# Altium footprint library THU VIEN PCB.PCBLib: 534 footprints (part 20 of 34)
Each footprint in its own frame and in the unit in brackets; x right, y up, seen from the top. Pads: shape width x height; smd on the part's side, far side on the other; paste and mask are expansions set on the pad; w line width, h text height; cw(c..) or ccw(c..) is an arc to the next point about the centre after c.
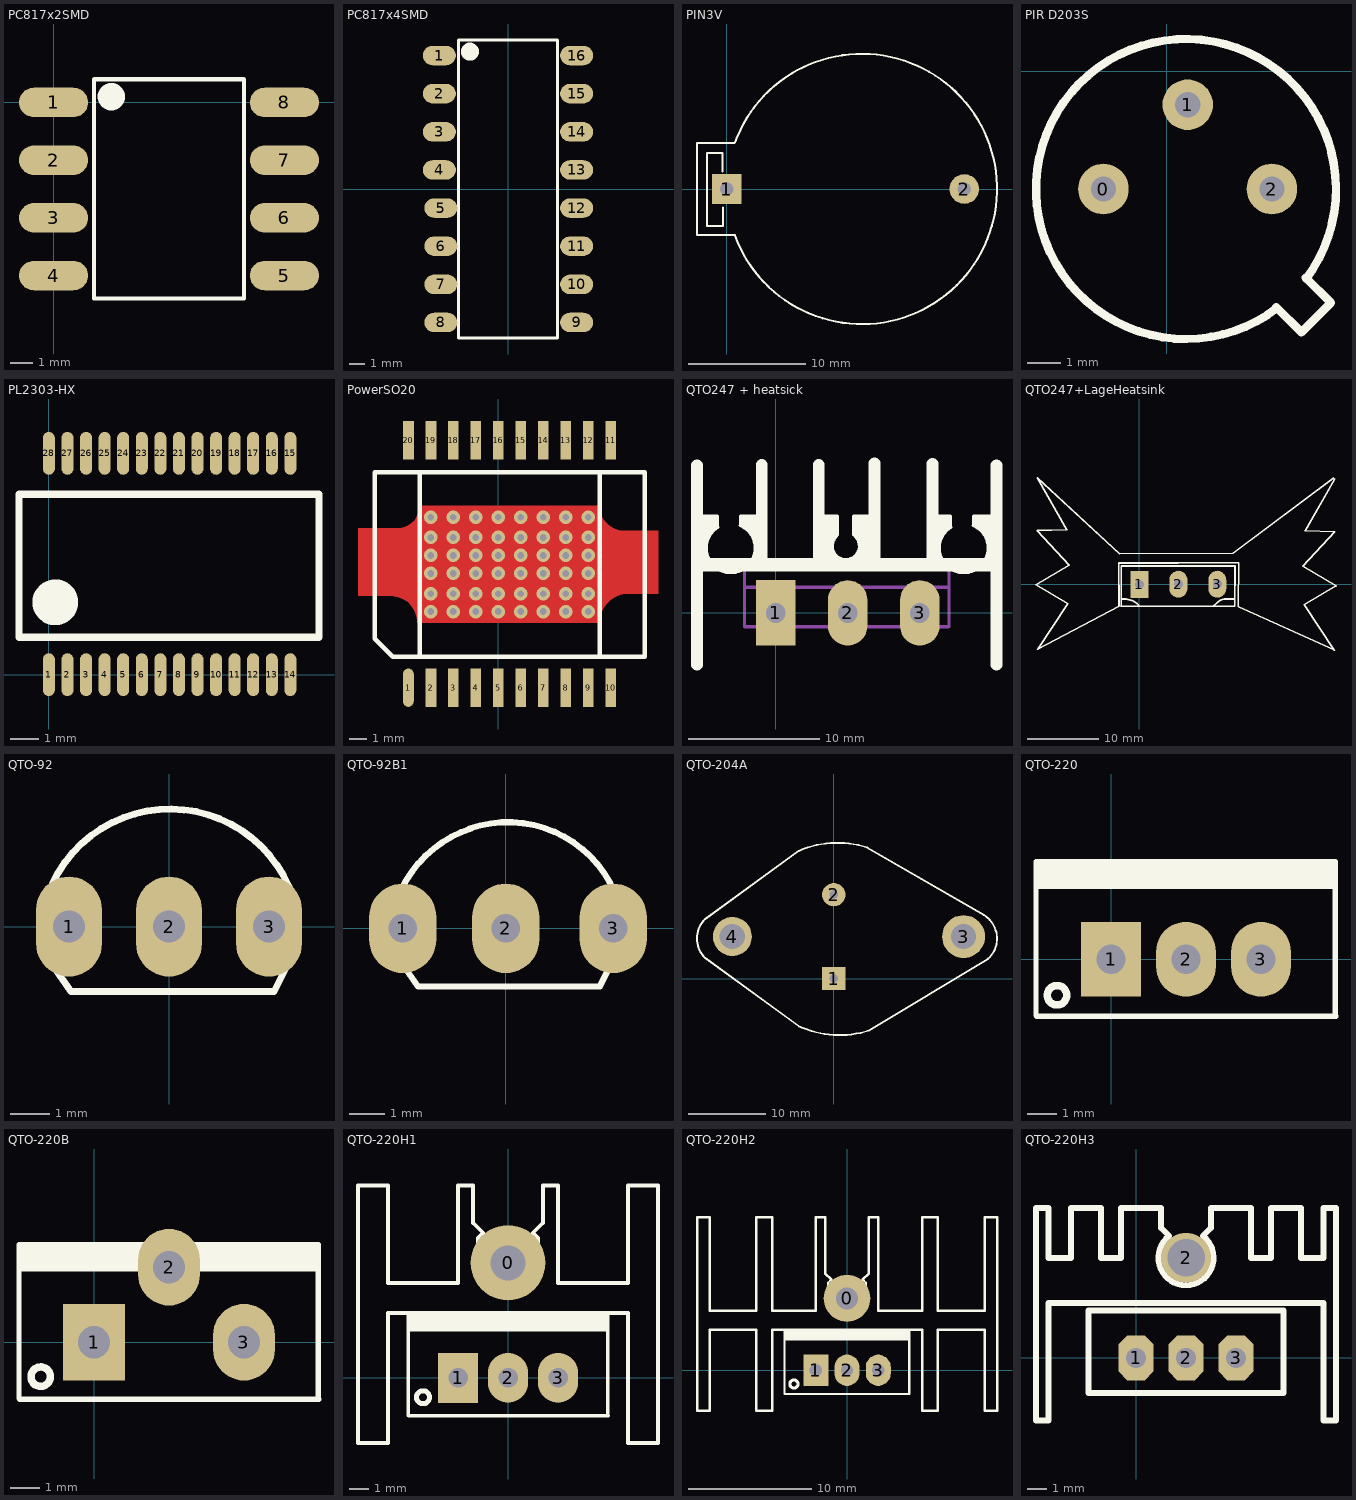
[diagram p19: the footprints below, top view; thin cyan lines are the x and y axes]

## PC817x2SMD [mm]
pads (8):
  oval 3.048x1.3 smd: 1(0,0) 2(0,-2.54) 3(0,-5.08) 4(0,-7.62) 5(10.16,-7.62) 6(10.16,-5.08) 7(10.16,-2.54) 8(10.16,0)
Top Overlay:
  circle w1: c2.54,0.254 r0.1
  lines w0.178: 1.778,1.016 1.778,-8.636 8.382,-8.636 8.382,1.016
  lines w0.2: 1.78,1.02 8.38,1.02
3D body "PC817 SMD.STEP": height 3.87, standoff 0.02, extent 0.229,-8.64 10.229,-4.06
3D body "PC817 SMD.STEP": height 3.87, standoff 0.02, extent 0.152,-3.585 10.152,0.995

## PC817x4SMD [mm] "SMD"
height 5
pads (16):
  oval 2.2x1.3 smd: 1(-4.572,8.89) 2(-4.572,6.35) 3(-4.572,3.81) 4(-4.572,1.27) 5(-4.472,-1.27) 6(-4.472,-3.81) 7(-4.472,-6.35) 8(-4.472,-8.89) 9(4.572,-8.89) 10(4.572,-6.35) 11(4.572,-3.81) 12(4.572,-1.27) 13(4.572,1.27) 14(4.572,3.81) 15(4.572,6.35) 16(4.572,8.89)
Top Overlay:
  circle w1: c-2.54,9.144 r0.1
  lines w0.2: -3.3,-9.91 -3.3,9.91 3.3,9.91 3.3,-9.91 -3.3,-9.91
3D body "PC817 SMD.STEP": height 3.87, standoff 0.02, extent -4.928,5.305 5.072,9.885
3D body "PC817 SMD.STEP": height 3.87, standoff 0.02, extent -4.851,0.25 5.149,4.83
3D body "PC817 SMD.STEP": height 3.87, standoff 0.02, extent -4.928,-4.881 5.072,-0.301
3D body "PC817 SMD.STEP": height 3.87, standoff 0.02, extent -4.928,-9.91 5.072,-5.33

## PIN3V [mil] "Socket PIN 3V"
pads (2):
  rect 100x100 hole 45: 1(0,0)
  round 100 hole 45: 2(800,0)
Top Overlay:
  lines w7: -14,59 -14,121 -66,121 -66,-124 -13,-124 -13,-63 ; 26.33,155 -100,155 -100,-155 27.93,-155 ; 27.6,156.07 cw(c455,0) 27.93,-156.97
3D body "batter2.STEP": height 278.16, standoff -137.2, extent -128.09,-446.83 1001.83,448.83

## PIR D203S [mil]
pads (3):
  round 60 hole 30: 0(-75,-140) 1(25,-40) 2(125,-140)
Top Overlay:
  lines w10: 130,-280 160,-310 195,-275 165,-245 ; 131.09,-281.42 cw(c23,-140) 165.51,-246.64
3D body "PIR_S_Orginal.step": height 185.04, standoff -78.74, extent -154.13,-317.94 204.14,39.14

## PL2303-HX [mil]
pads (28):
  oval 16.53x59.03 smd mask+7.9: 1(0,0) 2(25.6,0) 3(51.18,0) 4(76.78,0) 5(102.37,0) 6(127.97,0) 7(153.57,0) 8(179.15,0) 9(204.75,0) 10(230.35,0) 11(255.93,0) 12(281.53,0) 13(307.12,0) 14(332.7,0) 15(332.7,305) 16(307.12,305) 17(281.53,305) 18(255.93,305) 19(230.35,305) 20(204.75,305) 21(179.15,305) 22(153.57,305) 23(127.97,305) 24(102.37,305) 25(76.78,305) 26(51.18,305) 27(25.6,305) 28(0,305)
Top Overlay:
  circle w39.37: c8.8,99.7 r11.88
  lines w10: -41.22,51.66 -41.22,248.53 372.21,248.53 372.21,51.66 -41.22,51.66
3D body "SOP65P770x200-28N.step": height 84.65, standoff 0, extent -37.01,0.01 369.69,305.35

## PowerSO20 [mil]
pads (20):
  oval 24x85 smd: 1(-200,220.87)
  rect 24x85 smd: 2(-150,220.87) 3(-100,220.87) 4(-50,220.87) 5(0,220.87) 6(50,220.87) 7(100,220.87) 8(150,220.87) 9(200,220.87) 10(250,220.87) 11(250,770.87) 12(200,770.87) 13(150,770.87) 14(100,770.87) 15(50,770.87) 16(0,770.87) 17(-50,770.87) 18(-100,770.87) 19(-150,770.87) 20(-200,770.87)
via 200,390 diameter 30 hole 15
via 150,390 diameter 30 hole 15
via 100,390 diameter 30 hole 15
via 50,390 diameter 30 hole 15
via 0,390 diameter 30 hole 15
via -50,390 diameter 30 hole 15
via -100,390 diameter 30 hole 15
via -150,390 diameter 30 hole 15
via 200,430 diameter 30 hole 15
via 150,430 diameter 30 hole 15
via 100,430 diameter 30 hole 15
via 50,430 diameter 30 hole 15
via 0,430 diameter 30 hole 15
via -50,430 diameter 30 hole 15
via -100,430 diameter 30 hole 15
via -150,430 diameter 30 hole 15
via 200,475 diameter 30 hole 15
via 150,475 diameter 30 hole 15
via 100,475 diameter 30 hole 15
via 50,475 diameter 30 hole 15
via 0,475 diameter 30 hole 15
via -50,475 diameter 30 hole 15
via -100,475 diameter 30 hole 15
via -150,475 diameter 30 hole 15
via 200,515 diameter 30 hole 15
via 150,515 diameter 30 hole 15
via 100,515 diameter 30 hole 15
via 50,515 diameter 30 hole 15
via 0,515 diameter 30 hole 15
via -50,515 diameter 30 hole 15
via -100,515 diameter 30 hole 15
via -150,515 diameter 30 hole 15
via 200,555 diameter 30 hole 15
via 150,555 diameter 30 hole 15
via 100,555 diameter 30 hole 15
via 50,555 diameter 30 hole 15
via 0,555 diameter 30 hole 15
via -50,555 diameter 30 hole 15
via -100,555 diameter 30 hole 15
via -150,555 diameter 30 hole 15
via -150,600 diameter 30 hole 15
via -100,600 diameter 30 hole 15
via -50,600 diameter 30 hole 15
via 0,600 diameter 30 hole 15
via 50,600 diameter 30 hole 15
via 100,600 diameter 30 hole 15
via 150,600 diameter 30 hole 15
via 200,600 diameter 30 hole 15
Top Layer:
  region: 355,570 355,430 290,430 283.63,429.69 271.13,427.2 259.36,422.32 248.76,415.25 239.75,406.24 232.68,395.64 227.8,383.87 225.31,371.37 225,365 -180,365 -180.29,370.88 -182.58,382.42 -187.08,393.28 -193.62,403.06 -201.94,411.38 -211.72,417.92 -222.58,422.42 -234.12,424.71 -240,425 -312,425 -312,575 -225,575 -220.1,575.24 -210.49,577.15 -201.43,580.9 -193.28,586.35 -186.35,593.28 -180.9,601.43 -177.15,610.49 -175.24,620.1 -175,625 225,625 225.26,619.61 227.37,609.03 231.49,599.07 237.48,590.11 245.11,582.48 254.07,576.49 264.03,572.37 274.61,570.26 280,570
Top Overlay:
  lines w10: -175,290 -175,695 ; 225,295 225,695 ; -275,330 -275,700 325,700 325,300 325,290 -235,290 -275,330
3D body "PowerSO20.STEP": height 141.73, standoff 0, extent -289.92,211.54 340,778.46

## QTO247 + heatsick [mm]
pads (3):
  rect 3x5 hole 1.5: 1(0,0)
  oval 3x5 hole 1.5: 2(5.5,0) 3(11,0)
Top Overlay:
  region: -5.715,7.366 -4.445,7.366 -4.445,6.477 -4.572,6.477 -5.08,5.969 -5.08,5.715 -5.334,5.461 -5.334,4.572 -5.207,4.445 -5.207,4.064 -5.715,4.064
  region: -2.667,7.366 -2.667,6.731 -2.159,6.223 -2.032,6.223 -1.778,5.969 -1.778,5.715 -1.651,5.588 -1.651,4.064 -1.016,4.064 -0.889,4.191 -1.27,4.572 -1.27,7.366
  region: 15.113,7.366 15.113,6.731 15.621,6.223 15.748,6.223 16.002,5.969 16.002,5.715 16.129,5.588 16.129,4.064 16.764,4.064 16.891,4.191 16.51,4.572 16.51,7.366
  region: 12.065,7.366 13.335,7.366 13.335,6.477 13.208,6.477 12.7,5.969 12.7,5.715 12.446,5.461 12.446,4.572 12.573,4.445 12.573,4.064 12.065,4.064
  region: 3.556,7.366 4.826,7.366 4.826,6.096 4.318,5.588 4.318,4.572 4.826,4.064 3.556,4.064
  region: 5.842,7.366 7.366,7.366 7.366,3.81 7.112,4.064 5.842,4.064 6.35,4.572 6.35,5.588 5.842,6.096
  lines w0.254: -5.715,7.366 -4.445,7.366 -4.445,6.604 ; -4.412,6.55 ccw(c-3.429,4.953) -2.69,6.677 ; -2.667,6.731 -2.667,7.366 -1.397,7.366 ; 3.302,7.366 4.699,7.366 4.699,5.969 4.572,5.842 ; 4.622,5.835 ccw(c5.355,5.101) 6.089,5.835 ; 6.096,5.842 5.969,5.969 5.969,7.366 7.112,7.366 ; 12.065,7.366 13.335,7.366 13.335,6.604 ; 13.368,6.55 ccw(c14.351,4.953) 15.09,6.677 ; 15.113,6.731 15.113,7.366 16.383,7.366
  lines w0.889: -6.003,-3.962 -6.003,11.278 ; -1.067,3.785 -1.067,11.303 ; 3.277,3.785 3.277,11.303 ; 7.544,3.759 7.544,11.43 ; 11.963,3.759 11.963,11.379 ; 16.857,-3.962 16.857,11.278
  lines w1.016: -5.842,3.683 16.637,3.683
Mechanical 1:
  lines w0.254: -2.373,1.952 13.227,1.952 ; -2.373,-1.048 -2.373,3.452 13.227,3.452 13.227,-1.048 -2.373,-1.048
3D body "User Library-heat sink-1.STEP": height 30.64, standoff 0.02, extent -6.421,-4.233 16.479,12.167
3D body "SW3dPS-TO-247.STEP": height 23.89, standoff -12.18, extent -2.337,-1.854 12.903,2.718

## QTO247+LageHeatsink [mm]
pads (3):
  rect 2.54x3.81 hole 1.27: 1(0,-0.025)
  oval 2.54x3.81 hole 1.27: 2(5.5,0) 3(11,0)
Top Overlay:
  lines w0.254: -2.591,-3.073 -2.565,-3.048 -2.565,2.591 13.488,2.591 13.463,-3.099 -2.565,-3.099 -2.54,-3.073 ; -2.54,-2.083 -2.151,-2.083 cw(c-2.151,-4.945) -0.127,-2.921 ; 5.283,3.023 14.025,3.023 13.971,-3.168 27.483,-9.246 ; 5.436,2.997 -2.921,2.997 -2.87,-3.099 -14.376,-9.169 -10.109,-2.743 -14.605,-0.076 -9.931,2.692 -14.427,7.569 -10.236,7.696 -14.427,15.037 -2.819,4.318 13.208,4.369 27.381,14.986 ; 10.541,-3.023 ccw(c10.541,-2.961) 10.584,-3.005 11.024,-2.565 cw(c12.189,-3.731) 12.189,-2.083 13.462,-2.083 ; 27.534,-9.322 23.266,-2.896 27.762,-0.229 23.089,2.54 27.584,7.417 23.393,7.544 27.584,14.884
3D body "SW3dPS-to-247ad.STEP": height 25.57, standoff -15.5, extent -2.387,-2.54 13.563,2.49
3D body "SW3dPS-aavid 6298b.STEP": height 27.94, standoff 2.54, extent -15.723,-8.357 26.187,16.078

## QTO-92 [mil] "TO-92"
height 200
pads (3):
  oval 66x100 hole 32: 1(-100,0) 2(0,0) 3(100,0)
Top Overlay:
  lines w7: -116.52,43.21 cw(c0.97,-12.43) 119.94,39.97 ; -115.34,-40.24 -98,-65 105,-65 118,-39
3D body "SW3dPS-TO92.STEP": height 245.04, standoff -199.79, extent -108.87,-65.56 108.86,95

## QTO-92B1 [mil] "TO-92"
height 200
pads (3):
  oval 75x100 hole 32: 1(-115,0) 2(0,0) 3(120,0)
Top Overlay:
  lines w7: -116.52,43.21 cw(c0.97,-12.43) -38.82,111.34 ; -115.34,-40.24 -98,-65 105,-65 118,-39 ; -40.42,111.21 cw(c2.42,-11.53) 121.49,40.65
3D body "SW3dPS-TO92.STEP": height 245.04, standoff -199.79, extent -112.74,-65.56 105,95

## QTO-204A [mil] "Pin For 2N3055, 2N2955"
pads (4):
  rect 120x120 hole 45: 1(0,0)
  round 120 hole 45: 2(0,430)
  round 220 hole 130: 3(665,215)
  round 200 hole 130: 4(-520,215)
Top Overlay:
  lines w10: -660,105 cw(c-560,205) -660,305 -179.46,654.16 ; -659.88,104.89 -178.69,-244.72 ; -179.53,654.34 cw(c18.37,195.17) 171.59,671.11 ; -178.9,-245.19 ccw(c28.37,209.83) 180.47,-266.47 ; 171.46,670.71 769.34,325.52 ; 180.28,-266.15 789.88,100.13 ccw(c695,205) 769.25,325.36

## QTO-220 [mil] "TO-220 - 1-2-3"
height 200
pads (3):
  rect 80x100 hole 39: 1(0,0)
  oval 80x100 hole 39: 2(100,0) 3(200,0)
Top Overlay:
  circle w10: c-72.03,-48 r12.97
  rectangle: -99,94 300,130
  lines w7: 298,107 299,93 ; -100,-75 -100,130 299,130 299,-75 300,-76 -76,-76 -99,-76 -100,-75
3D body "SW3dPS-TO220AB.STEP": height 754.72, standoff -400, extent -119,-64 322.46,120.65

## QTO-220B [mm] "TO-220 - 1-2-3"
height 5.08
pads (3):
  rect 2.1x2.6 hole 1.1: 1(0,0)
  oval 2.1x2.6 hole 1.1: 2(2.54,2.54) 3(5.08,0)
Top Overlay:
  circle w0.254: c-1.804,-1.168 r0.329
  rectangle: -2.515,2.388 7.62,3.302
  lines w0.178: 7.569,2.718 7.595,2.362 ; -2.54,-1.905 -2.515,-1.93 -1.93,-1.93 7.62,-1.93 7.595,-1.905 7.595,3.302 -2.54,3.302 -2.54,-1.905
3D body "User Library-TO-220-1.STEP": height 20.58, standoff -8.2, extent -2.356,-2.062 7.544,2.438

## QTO-220H1 [mil] "TO-220 - 1-2-3"
height 200
pads (4):
  round 150 hole 70: 0(0,230)
  rect 80x100 hole 39: 1(-100,0)
  oval 80x100 hole 39: 2(0,0) 3(100,0)
Top Overlay:
  circle w10: c-170.03,-39 r12.97
  rectangle: -201,93 198,129
  lines w7: -200,100 198.5,100 199,93 ; -200,-75 -199,-76 -176,-76 200,-76 199,-75 199,130 -200,130 -200,-75
  lines w8: -300,-130 -300,385 -240,385 -240,190 -100,190 -100,385 -70,385 -70,310 -50,290 -60,280 -60,210 -40,190 40,190 60,210 60,280 50,290 70,310 70,385 100,385 100,190 240,190 240,385 300,385 300,-130 240,-130 240,130 -240,130 -240,-130 -300,-130
3D body "User Library-Disipador 34M8491-1.STEP": height 1000, standoff -122.05, extent -246,73.03 250.06,328.97
3D body "User Library-TO-220-1.STEP": height 850.24, standoff -282.83, extent -194.88,-82 194.88,95.17

## QTO-220H2 [mil] "TO-220 - 1-2-3"
height 200
pads (4):
  round 150 hole 70: 0(0,230)
  rect 80x100 hole 39: 1(-100,0)
  oval 80x100 hole 39: 2(0,0) 3(100,0)
Top Overlay:
  circle w10: c-169.97,-44 r12.97
  rectangle: -201,95 198,131
  lines w7: -200,100 198.5,100 199,93 ; -200,-75 -200,130 199,130 199,-75 200,-76 -176,-76 -199,-76 -200,-75
  lines w8: -480,-130 -440,-130 -440,130 -290,130 -290,-130 -240,-130 -240,130 240,130 240,-130 290,-130 290,130 440,130 440,-130 480,-130 480,490 440,490 440,190 290,190 290,490 240,490 240,190 100,190 100,490 70,490 70,310 50,290 60,280 60,210 40,190 -40,190 -60,210 -60,280 -50,290 -70,310 -70,490 -100,490 -100,190 -240,190 -240,490 -290,490 -290,190 -440,190 -440,490 -480,490 -480,-130
3D body "User Library-heat sink-1.STEP": height 1205.51, standoff 0, extent -448.79,-177 452.79,468.67
3D body "User Library-TO-220-1.STEP": height 810.24, standoff -322.83, extent -194.76,-82.17 195,95

## QTO-220H3 [mil] "TO-220 1-2-3"
pads (4):
  oct 70x90 hole 40: 1(0,0) 2(100,0) 3(200,0)
  round 100 hole 75: 2(100,200)
Top Overlay:
  lines w12: 66,244 50,260 50,300 -30,300 -30,200 -70,200 -70,300 -130,300 -130,200 -175,200 -175,300 -200,300 -200,-125 -175,-125 -175,110 375,110 375,-125 400,-125 400,300 375,300 375,200 330,200 330,300 270,300 270,200 230,200 230,300 150,300 150,260 133.59,243.59 ; 66.37,243.52 ccw(c100,200) 133.77,243.41 ; -95,-70 295,-70 295,95 -95,95 -95,-70
3D body "User Library-TO-220-1.STEP": height 322.83, standoff -810.24, extent -96.88,-76.17 292.88,101
3D body "SW3dPS-heatsink TO126.STEP": height 984.25, standoff -149.61, extent -189.97,-102.25 391.97,323